# Altium footprint library Conectori.PcbLib: 65 footprints (part 5 of 5)
Each footprint in its own frame and in the unit in brackets; x right, y up, seen from the top. Pads: shape width x height; smd on the part's side, far side on the other; paste and mask are expansions set on the pad; w line width, h text height; cw(c..) or ccw(c..) is an arc to the next point about the centre after c.
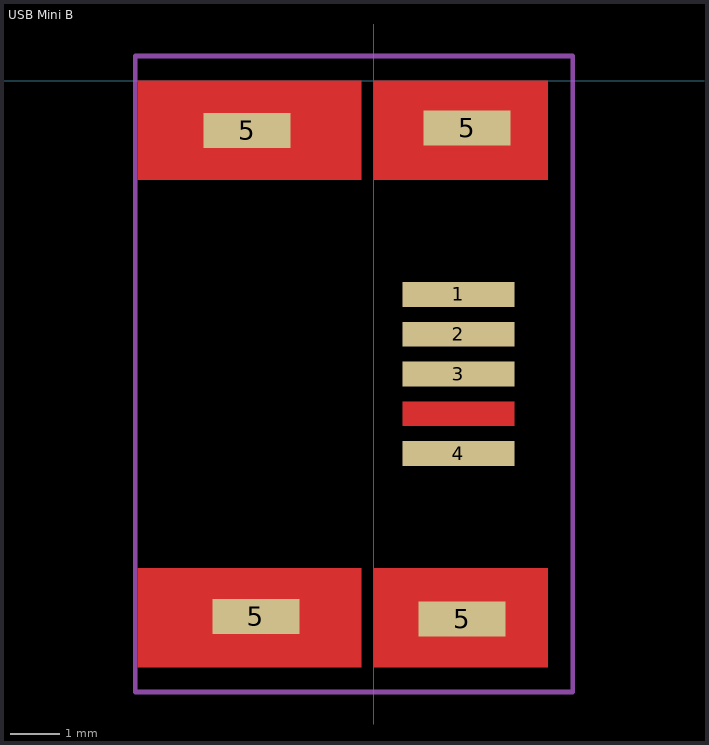
[diagram p4: the footprint, top view; thin cyan lines are the x and y axes]

## USB Mini B [mm]
pads (8):
  rect 2.25x0.5 smd: 1(1.7,-4.3) 2(1.7,-5.1) 3(1.7,-5.9) 4(1.7,-7.5)
  rect 1.75x0.7 smd: 5(-2.55,-1) 5(-2.375,-10.775) 5(1.775,-10.825) 5(1.875,-0.95)
Top Layer:
  rectangle: 0.575,-6.95 2.825,-6.45
  rectangle: 0,-2 3.5,0
  rectangle: -4.75,-2 -0.25,0
  rectangle: -4.75,-11.8 -0.25,-9.8
  rectangle: 0,-11.8 3.5,-9.8
Top Solder:
  rectangle: -4.775,-11.85 -0.2,-9.75
  rectangle: -0.05,-11.85 3.55,-9.75
  rectangle: -0.05,-2.05 3.55,0.05
  rectangle: -4.8,-2.05 -0.2,0.05
  rectangle: 0.475,-7.05 2.925,-6.35
Mechanical 15:
  lines w0.1: -4.8,-12.3 -4.8,0.5 4,0.5 4,-12.3 -4.8,-12.3
3D body "User Library-USB-Mini-B.step": height 1.95, standoff -3.8, extent -5,-9.75 4,-2.05